# Altium footprint library 13-IC Packages-2smt2e.PcbLib: 86 footprints (part 3 of 6)
Each footprint in its own frame and in the unit in brackets; x right, y up, seen from the top. Pads: shape width x height; smd on the part's side, far side on the other; paste and mask are expansions set on the pad; w line width, h text height; cw(c..) or ccw(c..) is an arc to the next point about the centre after c.
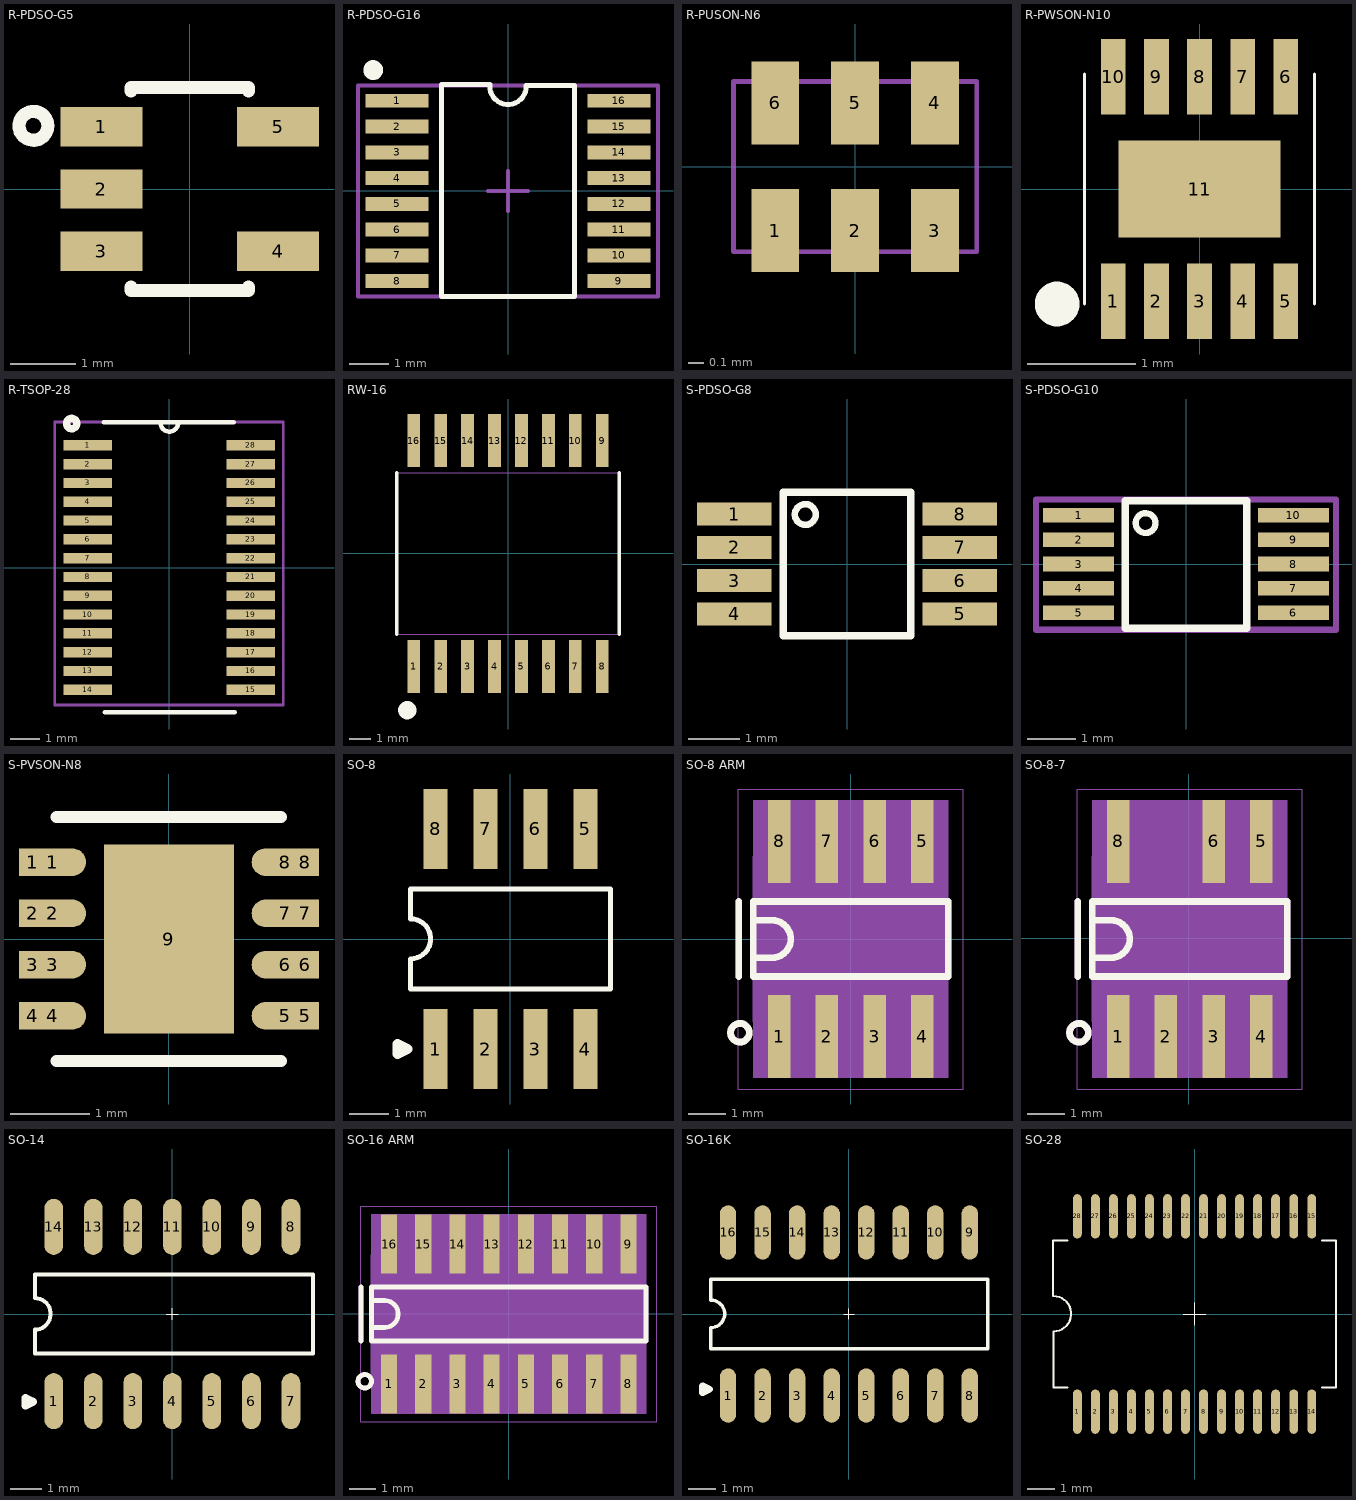
[diagram p2: the footprints below, top view; thin cyan lines are the x and y axes]

## R-PDSO-G5 [mm]
pads (5):
  rect 1.25x0.6 smd mask+0.07: 1(-1.35,0.95) 2(-1.35,0) 3(-1.35,-0.95) 4(1.35,-0.95) 5(1.35,0.95)
Top Overlay:
  circle w0.2: c-2.388,0.965 r0.22
  lines w0.2: -0.9,-1.5 -0.9,-1.55 0.9,-1.55 0.9,-1.5 ; -0.9,1.5 -0.9,1.55 0.9,1.55 0.9,1.5
3D body "tsot-23-5.stp": height 1, standoff 0.01, extent -1.475,-1.45 1.475,1.45

## R-PDSO-G16 [mm]
pads (16):
  rect 1.6x0.35 smd mask+0.07: 1(-2.8,2.275) 2(-2.8,1.625) 3(-2.8,0.975) 4(-2.8,0.325) 5(-2.8,-0.325) 6(-2.8,-0.975) 7(-2.8,-1.625) 8(-2.8,-2.275) 10(2.8,-1.625) 11(2.8,-0.975) 12(2.8,-0.325) 13(2.8,0.325) 14(2.8,0.975) 15(2.8,1.625) 16(2.8,2.275)
  rect 1.6x0.35 smd: 9(2.8,-2.275)
Top Overlay:
  circle w0.25: c-3.4,3.05 r0.125
  lines w0.127: -0.46,2.642 ccw(c0,2.642) 0.46,2.642 ; -0.457,2.692 -1.676,2.692 -1.676,-2.667 1.676,-2.667 1.676,2.667 0.457,2.667
Mechanical 15:
  lines w0.1: -0.5,0 0.5,0 ; 0,-0.5 0,0.5 ; -3.785,-2.667 -3.785,2.667 3.785,2.667 3.785,-2.667 -3.785,-2.667
3D body "r-pdso-g16.stp": height 1.2, standoff 0, extent -3.3,-2.55 3.3,2.55

## R-PUSON-N6 [mm]
pads (6):
  rect 0.3x0.52 smd mask+0.05: 1(-0.5,-0.4) 2(0,-0.4) 3(0.5,-0.4) 4(0.5,0.4) 5(0,0.4) 6(-0.5,0.4)
Top Solder:
  circle w0.1: c-0.889,-0.838 r0.102
  rectangle: 0.787,-0.508 0.889,0.508
  rectangle: -0.889,-0.508 -0.787,0.508
Mechanical 15:
  lines w0.03: -0.762,-0.533 0.762,-0.533 0.762,0.533 -0.762,0.533 -0.762,-0.533
3D body "tps62732.stp": height 0.61, standoff 0, extent -0.75,-0.525 0.75,0.525
3D body "0_254-0_508.stp": height 0.01, standoff 0, extent -0.127,-0.66 0.127,-0.152
3D body "0_254-0_508.stp": height 0.01, standoff 0, extent -0.635,-0.66 -0.381,-0.152
3D body "0_254-0_508.stp": height 0.01, standoff 0, extent 0.381,-0.66 0.635,-0.152
3D body "0_254-0_508.stp": height 0.01, standoff 0, extent 0.381,0.152 0.635,0.66
3D body "0_254-0_508.stp": height 0.01, standoff 0, extent -0.127,0.152 0.127,0.66
3D body "0_254-0_508.stp": height 0.01, standoff 0, extent -0.635,0.152 -0.381,0.66

## R-PWSON-N10 [mm]
pads (11):
  rect 0.23x0.7 smd mask+0.07: 1(-0.8,-1.041) 2(-0.4,-1.041) 3(0,-1.041) 4(0.4,-1.041) 5(0.8,-1.041) 6(0.8,1.041) 7(0.4,1.041) 8(0,1.041) 9(-0.4,1.041) 10(-0.8,1.041)
  rect 1.5x0.9 smd mask+0.051: 11(0,0)
Top Overlay:
  circle w0.254: c-1.321,-1.067 r0.08
  lines w0.025: -1.067,-1.067 -1.067,1.067 ; 1.067,-1.067 1.067,1.067
3D body "r-pwson-n10.stp": height 0.7, standoff 0, extent -1.05,-1.06 1.05,1.06

## R-TSOP-28 [mil]
pads (28):
  rect 66x14 smd: 1(-111,166.34) 2(-111,140.75) 3(-111,115.16) 4(-111,89.57) 5(-111,63.98) 6(-111,38.39) 7(-111,12.8) 8(-111,-12.8) 9(-111,-38.39) 10(-111,-63.98) 11(-111,-89.57) 12(-111,-115.16) 13(-111,-140.75) 14(-111,-166.34) 15(111,-166.34) 16(111,-140.75) 17(111,-115.16) 18(111,-89.57) 19(111,-63.98) 20(111,-38.39) 21(111,-12.8) 22(111,12.8) 23(111,38.39) 24(111,63.98) 25(111,89.57) 26(111,115.16) 27(111,140.75) 28(111,166.34)
Top Overlay:
  circle w10: c-133,196 r7
  lines w6: -89.5,198 87.5,198 ; -88,-197 89,-197 ; -12,197 ccw(c0,197) 12,197
Mechanical 15:
  lines w3.94: -156,-187 -156,198 155,198 155,-187 -156,-187
3D body "0_35-1_7.stp": height 0.39, standoff 0, extent 77.54,159.46 144.47,173.24
3D body "0_35-1_7.stp": height 0.39, standoff 0, extent 77.54,133.87 144.47,147.65
3D body "0_35-1_7.stp": height 0.39, standoff 0, extent 77.54,108.28 144.47,122.06
3D body "0_35-1_7.stp": height 0.39, standoff 0, extent 77.54,82.69 144.47,96.46
3D body "0_35-1_7.stp": height 0.39, standoff 0, extent 77.54,57.09 144.47,70.87
3D body "0_35-1_7.stp": height 0.39, standoff 0, extent 77.54,31.5 144.47,45.28
3D body "0_35-1_7.stp": height 0.39, standoff 0, extent 77.54,5.91 144.47,19.69
3D body "0_35-1_7.stp": height 0.39, standoff 0, extent 77.54,-19.68 144.47,-5.9
3D body "0_35-1_7.stp": height 0.39, standoff 0, extent 77.54,-45.27 144.47,-31.49
3D body "0_35-1_7.stp": height 0.39, standoff 0, extent 77.54,-70.86 144.47,-57.08
3D body "0_35-1_7.stp": height 0.39, standoff 0, extent 77.54,-96.45 144.47,-82.67
3D body "0_35-1_7.stp": height 0.39, standoff 0, extent 77.54,-122.04 144.47,-108.26
3D body "0_35-1_7.stp": height 0.39, standoff 0, extent 77.54,-147.63 144.47,-133.85
3D body "0_35-1_7.stp": height 0.39, standoff 0, extent 77.54,-173.22 144.47,-159.44
3D body "0_35-1_7.stp": height 0.39, standoff 0, extent -144.46,-173.22 -77.53,-159.44
3D body "0_35-1_7.stp": height 0.39, standoff 0, extent -144.46,-147.63 -77.53,-133.85
3D body "0_35-1_7.stp": height 0.39, standoff 0, extent -144.46,-122.04 -77.53,-108.26
3D body "0_35-1_7.stp": height 0.39, standoff 0, extent -144.46,-96.45 -77.53,-82.67
3D body "0_35-1_7.stp": height 0.39, standoff 0, extent -144.46,-70.86 -77.53,-57.08
3D body "0_35-1_7.stp": height 0.39, standoff 0, extent -144.46,-45.27 -77.53,-31.49
3D body "0_35-1_7.stp": height 0.39, standoff 0, extent -144.46,-19.68 -77.53,-5.9
3D body "0_35-1_7.stp": height 0.39, standoff 0, extent -144.46,5.91 -77.53,19.69
3D body "0_35-1_7.stp": height 0.39, standoff 0, extent -144.46,31.5 -77.53,45.28
3D body "0_35-1_7.stp": height 0.39, standoff 0, extent -144.46,57.09 -77.53,70.87
3D body "0_35-1_7.stp": height 0.39, standoff 0, extent -144.46,82.69 -77.53,96.46
3D body "0_35-1_7.stp": height 0.39, standoff 0, extent -144.46,108.28 -77.53,122.06
3D body "0_35-1_7.stp": height 0.39, standoff 0, extent -144.46,133.87 -77.53,147.65
3D body "0_35-1_7.stp": height 0.39, standoff 0, extent -144.46,159.46 -77.53,173.24
3D body "r-pdso-g28.stp": height 47.64, standoff 0, extent -128.78,-192.92 128.78,192.91

## RW-16 [mm]
pads (16):
  rect 0.6x2.5 smd: 1(-4.445,-5.325)
  rect 0.6x2.5 smd mask+0.07: 2(-3.175,-5.325) 3(-1.905,-5.325) 4(-0.635,-5.325) 5(0.635,-5.325) 6(1.905,-5.325) 7(3.175,-5.325) 8(4.445,-5.325) 9(4.445,5.325) 10(3.175,5.325) 11(1.905,5.325) 12(0.635,5.325) 13(-0.635,5.325) 14(-1.905,5.325) 15(-3.175,5.325) 16(-4.445,5.325)
Top Overlay:
  circle w0.5: c-4.75,-7.391 r0.178
  lines w0.178: -5.25,-3.8 -5.25,3.8 ; 5.25,-3.8 5.25,3.8
Mechanical 15:
  lines w0.03: -5.25,-3.8 5.25,-3.8 5.25,3.8 -5.25,3.8 -5.25,-3.8
3D body "0_55-2_5.stp": height 0.01, standoff 0, extent -4.695,-6.609 -4.145,-4.109
3D body "0_55-2_5.stp": height 0.01, standoff 0, extent -4.72,4.066 -4.17,6.566
3D body "0_55-2_5.stp": height 0.01, standoff 0, extent -3.45,4.066 -2.9,6.566
3D body "0_55-2_5.stp": height 0.01, standoff 0, extent -2.18,4.066 -1.63,6.566
3D body "0_55-2_5.stp": height 0.01, standoff 0, extent -0.91,4.066 -0.36,6.566
3D body "0_55-2_5.stp": height 0.01, standoff 0, extent 0.36,4.066 0.91,6.566
3D body "0_55-2_5.stp": height 0.01, standoff 0, extent 1.63,4.066 2.18,6.566
3D body "0_55-2_5.stp": height 0.01, standoff 0, extent 2.9,4.066 3.45,6.566
3D body "0_55-2_5.stp": height 0.01, standoff 0, extent 4.17,4.066 4.72,6.566
3D body "0_55-2_5.stp": height 0.01, standoff 0, extent 4.17,-6.584 4.72,-4.084
3D body "0_55-2_5.stp": height 0.01, standoff 0, extent 2.9,-6.584 3.45,-4.084
3D body "0_55-2_5.stp": height 0.01, standoff 0, extent 1.63,-6.584 2.18,-4.084
3D body "0_55-2_5.stp": height 0.01, standoff 0, extent 0.36,-6.584 0.91,-4.084
3D body "0_55-2_5.stp": height 0.01, standoff 0, extent -0.91,-6.584 -0.36,-4.084
3D body "0_55-2_5.stp": height 0.01, standoff 0, extent -2.18,-6.584 -1.63,-4.084
3D body "0_55-2_5.stp": height 0.01, standoff 0, extent -3.45,-6.584 -2.9,-4.084
3D body "0_55-2_5.stp": height 0.01, standoff 0, extent -4.745,-6.584 -4.195,-4.084
3D body "rw-16.stp": height 2.65, standoff 0.03, extent -5.25,-5.325 5.25,5.325

## S-PDSO-G8 [mm]
pads (8):
  rect 1.45x0.45 smd mask+0.05: 1(-2.2,0.975) 2(-2.2,0.325) 3(-2.2,-0.325) 4(-2.2,-0.975) 5(2.2,-0.975) 6(2.2,-0.325) 7(2.2,0.325) 8(2.2,0.975)
Top Overlay:
  circle w0.127: c-0.813,0.965 r0.203
  lines w0.152: -1.245,-1.4 1.245,-1.4 1.245,1.4 -1.245,1.4 -1.245,-1.4
3D body "ms0p-8l.stp": height 1.1, standoff 0.03, extent -2.45,-1.5 2.45,1.5

## S-PDSO-G10 [mm]
pads (10):
  rect 1.45x0.3 smd mask+0.05: 1(-2.2,1) 2(-2.2,0.5) 3(-2.2,0) 4(-2.2,-0.5) 5(-2.2,-1) 6(2.2,-1) 7(2.2,-0.5) 8(2.2,0) 9(2.2,0.5) 10(2.2,1)
Top Overlay:
  circle w0.127: c-0.828,0.838 r0.203
  lines w0.152: -1.245,-1.321 -1.245,1.295 1.245,1.295 1.245,-1.321 -1.245,-1.321
Mechanical 15:
  lines w0.127: -3.073,-1.346 -3.073,1.321 3.073,1.321 3.073,-1.346 -3.073,-1.346
3D body "s-pdso-g10.stp": height 1.1, standoff 0, extent -2.53,-1.55 2.53,1.55

## S-PVSON-N8 [mm]
pads (17):
  rect 0.35x0.35 smd mask+0.05: 1(-1.725,0.975) 2(-1.725,0.325) 3(-1.725,-0.325) 4(-1.725,-0.975) 5(1.729,-0.975) 6(1.729,-0.325) 7(1.729,0.325) 8(1.729,0.975)
  oval 0.85x0.35 smd mask+0.05: 1(-1.475,0.975) 2(-1.475,0.325) 3(-1.475,-0.325) 4(-1.475,-0.975) 5(1.475,-0.975) 6(1.475,-0.325) 7(1.475,0.325) 8(1.475,0.975)
  rect 1.65x2.4 smd mask+0.05: 9(0,0)
Top Overlay:
  lines w0.152: -1.422,-1.549 1.422,-1.549 ; -1.422,1.549 1.422,1.549
3D body "s-pvson-n8.stp": height 1, standoff 0, extent -1.505,-1.5 1.505,1.5

## SO-8 [mil]
pads (8):
  rect 24x80 smd mask+2.76: 1(-75,-110.24) 2(-25,-110.24) 3(25,-110.24) 4(75,-110.24) 5(75,110.24) 6(25,110.24) 7(-25,110.24)
  rect 24x80 smd: 8(-75,110.24)
Top Overlay:
  lines w5: -100,-50 100,-50 100,50 -100,50 -100,20.18 ; -99.97,-49.97 -99.97,-19.85 ccw(c-99.97,0.15) -99.97,20.15
  lines w10: -113,-115 -103,-110 -113,-105 -113,-115
3D body "sop-j8.stp": height 54.13, standoff -3.94, extent -96.45,-118.11 96.46,115.75
3D body "0_66-2_032.stp": height 0.79, standoff 0, extent -87.99,70 -62,150
3D body "0_66-2_032.stp": height 0.79, standoff 0, extent -37.99,70 -12,150
3D body "0_66-2_032.stp": height 0.79, standoff 0, extent 13.01,70 39,150
3D body "0_66-2_032.stp": height 0.79, standoff 0, extent 62.01,70 88,150
3D body "0_66-2_032.stp": height 0.79, standoff 0, extent -87.99,-150 -62,-70
3D body "0_66-2_032.stp": height 0.79, standoff 0, extent -37.99,-150 -12,-70
3D body "0_66-2_032.stp": height 0.79, standoff 0, extent 13.01,-150 39,-70
3D body "0_66-2_032.stp": height 0.79, standoff 0, extent 61.01,-150 87,-70

## SO-8 ARM [mm]
pads (8):
  rect 0.6x2.2 smd: 1(-1.905,-2.6) 2(-0.635,-2.6) 3(0.635,-2.6) 4(1.905,-2.6) 5(1.905,2.6) 6(0.635,2.6) 7(-0.635,2.6) 8(-1.905,2.6)
Top Overlay:
  circle w0.18: c-2.955,-2.5 r0.25
  lines w0.18: -2.99,-1 -2.99,1 ; -2.6,-0.5 -2.1,-0.5 ccw(c-2.1,0) -2.1,0.5 -2.6,0.5 ; -2.6,1 -2.6,-1 2.6,-1 2.6,1 -2.57,1
Mechanical 6:
  lines w0.18: -2.99,-1 -2.99,1 ; -2.6,-0.5 -2.1,-0.5 ccw(c-2.1,0) -2.1,0.5 -2.6,0.5 ; -2.6,1 -2.6,-1 2.6,-1 2.6,1 -2.57,1 ; -3.205,-2.5 cw(c-2.955,-2.5) -2.955,-2.25 cw(c-2.955,-2.5) -2.705,-2.5 cw(c-2.955,-2.5) -2.955,-2.75 cw(c-2.955,-2.5) -3.205,-2.5
Mechanical 16:
  circle w0.025: c-2.1,-1.1 r0.2
  region: -2.6,3.7 2.6,3.7 2.6,-3.7 -2.6,-3.7
  pour cut-out: -0.953,0.459 -1.128,0.424 -1.277,0.324 -1.376,0.176 -1.411,0 -1.376,-0.176 -1.277,-0.324 -1.128,-0.424 -0.953,-0.459 -0.777,-0.424 -0.628,-0.324 -0.529,-0.176 -0.494,0 -0.529,0.176 -0.628,0.324 -0.777,0.424
  pour cut-out: 0.953,0.459 0.777,0.424 0.628,0.324 0.529,0.176 0.494,0 0.529,-0.176 0.628,-0.324 0.777,-0.424 0.953,-0.459 1.128,-0.424 1.277,-0.324 1.376,-0.176 1.411,0 1.376,0.176 1.277,0.324 1.128,0.424
  lines w0.025: -2.6,-1.5 2.6,-1.5 ; -3,-4 -3,4 3,4 3,-4 -3,-4 ; -2.6,-2.2 -2.6,2.2 2.6,2.2 2.6,-2.2 -2.6,-2.2 ; -2.16,-3.1 -1.65,-3.1 -1.65,-2.2 -2.16,-2.2 -2.16,-3.1 ; -2.16,2.2 -2.16,3.1 -1.65,3.1 -1.65,2.2 -2.16,2.2 ; -0.89,-3.1 -0.38,-3.1 -0.38,-2.2 -0.89,-2.2 -0.89,-3.1 ; -0.89,2.2 -0.89,3.1 -0.38,3.1 -0.38,2.2 -0.89,2.2 ; 0.38,-3.1 0.89,-3.1 0.89,-2.2 0.38,-2.2 0.38,-3.1 ; 0.38,2.2 0.38,3.1 0.89,3.1 0.89,2.2 0.38,2.2 ; 1.65,-3.1 2.16,-3.1 2.16,-2.2 1.65,-2.2 1.65,-3.1 ; 1.65,2.2 1.65,3.1 2.16,3.1 2.16,2.2 1.65,2.2
Mechanical 18:
  text "8" at -1.905,2.4 h0.5
  text "2" at -0.635,-2.8 h0.5
  text "3" at 0.635,-2.8 h0.5
  text "4" at 1.905,-2.8 h0.5
  text "7" at -0.635,2.4 h0.5
  text "1" at -1.905,-2.8 h0.5
  text "5" at 1.905,2.4 h0.5
  text "6" at 0.635,2.4 h0.5
3D body "sop-j8.stp": height 1.38, standoff -0.1, extent -2.45,-3 2.45,2.94
3D body "so8-arm.stp": height 0, standoff 0, extent -2.205,1.5 -1.605,3.7
3D body "so8-arm.stp": height 0, standoff 0, extent -0.935,1.5 -0.335,3.7
3D body "so8-arm.stp": height 0, standoff 0, extent 0.335,1.5 0.935,3.7
3D body "so8-arm.stp": height 0, standoff 0, extent 1.605,1.5 2.205,3.7
3D body "so8-arm.stp": height 0, standoff 0, extent -2.205,-3.7 -1.605,-1.5
3D body "so8-arm.stp": height 0, standoff 0, extent -0.935,-3.7 -0.335,-1.5
3D body "so8-arm.stp": height 0, standoff 0, extent 0.335,-3.7 0.935,-1.5
3D body "so8-arm.stp": height 0, standoff 0, extent 1.605,-3.7 2.205,-1.5

## SO-8-7 [mm]
pads (7):
  rect 0.6x2.2 smd: 1(-1.88,-2.625) 2(-0.61,-2.625) 3(0.66,-2.625) 4(1.93,-2.625) 5(1.93,2.575) 6(0.66,2.575) 8(-1.88,2.575)
Top Overlay:
  circle w0.18: c-2.93,-2.525 r0.25
  lines w0.18: -2.965,-1.025 -2.965,0.975 ; -2.575,-0.525 -2.075,-0.525 ccw(c-2.075,-0.025) -2.075,0.475 -2.575,0.475 ; -2.575,0.975 -2.575,-1.025 2.625,-1.025 2.625,0.975 -2.545,0.975
Mechanical 6:
  lines w0.18: -2.965,-1.025 -2.965,0.975 ; -2.575,-0.525 -2.075,-0.525 ccw(c-2.075,-0.025) -2.075,0.475 -2.575,0.475 ; -2.575,0.975 -2.575,-1.025 2.625,-1.025 2.625,0.975 -2.545,0.975 ; -3.18,-2.525 ccw(c-2.93,-2.525) -2.93,-2.775 ccw(c-2.93,-2.525) -2.68,-2.525 ccw(c-2.93,-2.525) -2.93,-2.275 ccw(c-2.93,-2.525) -3.18,-2.525
Mechanical 16:
  circle w0.025: c-2.075,-1.125 r0.2
  pour cut-out: 0.978,0.433 0.802,0.398 0.653,0.299 0.554,0.15 0.519,-0.025 0.554,-0.201 0.653,-0.35 0.802,-0.449 0.978,-0.484 1.153,-0.449 1.302,-0.35 1.402,-0.201 1.437,-0.025 1.402,0.15 1.302,0.299 1.153,0.398
  pour cut-out: -0.927,0.433 -1.103,0.398 -1.252,0.299 -1.351,0.15 -1.386,-0.025 -1.351,-0.201 -1.252,-0.35 -1.103,-0.449 -0.927,-0.484 -0.752,-0.449 -0.603,-0.35 -0.503,-0.201 -0.468,-0.025 -0.503,0.15 -0.603,0.299 -0.752,0.398
  region: -2.575,3.675 2.625,3.675 2.625,-3.725 -2.575,-3.725
  lines w0.025: -2.575,-1.525 2.625,-1.525 ; -2.975,-4.025 3.025,-4.025 3.025,3.975 -2.975,3.975 -2.975,-4.025 ; -2.575,-2.225 2.625,-2.225 2.625,2.175 -2.575,2.175 -2.575,-2.225 ; -2.135,-3.125 -2.135,-2.225 -1.625,-2.225 -1.625,-3.125 -2.135,-3.125 ; -2.135,2.175 -1.625,2.175 -1.625,3.075 -2.135,3.075 -2.135,2.175 ; -0.865,-3.125 -0.865,-2.225 -0.355,-2.225 -0.355,-3.125 -0.865,-3.125 ; 0.405,-3.125 0.405,-2.225 0.915,-2.225 0.915,-3.125 0.405,-3.125 ; 0.405,2.175 0.915,2.175 0.915,3.075 0.405,3.075 0.405,2.175 ; 1.675,-3.125 1.675,-2.225 2.185,-2.225 2.185,-3.125 1.675,-3.125 ; 1.675,2.175 2.185,2.175 2.185,3.075 1.675,3.075 1.675,2.175
Mechanical 18:
  text "6" at 0.66,2.375 h0.5
  text "5" at 1.93,2.375 h0.5
  text "1" at -1.88,-2.825 h0.5
  text "7" at -0.61,2.375 h0.5
  text "4" at 1.93,-2.825 h0.5
  text "3" at 0.66,-2.825 h0.5
  text "2" at -0.61,-2.825 h0.5
  text "8" at -1.88,2.375 h0.5
3D body "so8-arm.stp": height 0, standoff 0, extent 1.63,-3.725 2.23,-1.525
3D body "so8-arm.stp": height 0, standoff 0, extent 0.36,-3.725 0.96,-1.525
3D body "so8-arm.stp": height 0, standoff 0, extent -0.91,-3.725 -0.31,-1.525
3D body "so8-arm.stp": height 0, standoff 0, extent -2.18,-3.725 -1.58,-1.525
3D body "so8-arm.stp": height 0, standoff 0, extent 1.63,1.475 2.23,3.675
3D body "so8-arm.stp": height 0, standoff 0, extent 0.36,1.475 0.96,3.675
3D body "so8-arm.stp": height 0, standoff 0, extent -2.18,1.475 -1.58,3.675
3D body "so-8-7.stp": height 1.7, standoff 0, extent -2.5,-3 2.5,3

## SO-14 [mm]
pads (14):
  oval 0.6x1.8 smd mask+0.07: 1(-3.81,-2.8) 2(-2.54,-2.8) 3(-1.27,-2.8) 5(1.27,-2.8) 6(2.54,-2.8) 7(3.81,-2.8) 8(3.81,2.8) 9(2.54,2.8) 10(1.27,2.8) 11(0,2.8) 12(-1.27,2.8) 13(-2.54,2.8) 14(-3.81,2.8)
  oval 0.6x1.8 smd mask+0.051: 4(0,-2.8)
Top Overlay:
  lines w0.01: -0.191,0 0.191,0 ; 0,-0.191 0,0.191
  lines w0.127: -4.42,-1.27 4.521,-1.27 4.521,1.27 -4.42,1.27 -4.42,0.513 ; -4.419,-1.269 -4.419,-0.504 ccw(c-4.419,0.004) -4.419,0.512
  lines w0.254: -4.724,-2.946 -4.724,-2.692 -4.47,-2.819 -4.724,-2.946
3D body "sop-14.stp": height 1.5, standoff -0.08, extent -4.315,-3.1 4.385,3.112
3D body "0_66-2_032.stp": height 0.02, standoff 0, extent 3.48,-3.716 4.14,-1.684
3D body "0_66-2_032.stp": height 0.02, standoff 0, extent 2.21,-3.716 2.87,-1.684
3D body "0_66-2_032.stp": height 0.02, standoff 0, extent 0.94,-3.716 1.6,-1.684
3D body "0_66-2_032.stp": height 0.02, standoff 0, extent -0.33,-3.716 0.33,-1.684
3D body "0_66-2_032.stp": height 0.02, standoff 0, extent -1.6,-3.716 -0.94,-1.684
3D body "0_66-2_032.stp": height 0.02, standoff 0, extent -2.87,-3.716 -2.21,-1.684
3D body "0_66-2_032.stp": height 0.02, standoff 0, extent -4.14,-3.716 -3.48,-1.684
3D body "0_66-2_032.stp": height 0.02, standoff 0, extent 3.48,1.684 4.14,3.716
3D body "0_66-2_032.stp": height 0.02, standoff 0, extent 2.21,1.684 2.87,3.716
3D body "0_66-2_032.stp": height 0.02, standoff 0, extent 0.94,1.684 1.6,3.716
3D body "0_66-2_032.stp": height 0.02, standoff 0, extent -0.33,1.684 0.33,3.716
3D body "0_66-2_032.stp": height 0.02, standoff 0, extent -1.6,1.684 -0.94,3.716
3D body "0_66-2_032.stp": height 0.02, standoff 0, extent -2.87,1.684 -2.21,3.716
3D body "0_66-2_032.stp": height 0.02, standoff 0, extent -4.14,1.684 -3.48,3.716

## SO-16 ARM [mm]
pads (16):
  rect 0.6x2.2 smd: 1(-4.445,-2.6) 2(-3.175,-2.6) 3(-1.905,-2.6) 4(-0.635,-2.6) 5(0.635,-2.6) 6(1.905,-2.6) 7(3.175,-2.6) 8(4.445,-2.6) 9(4.445,2.6) 10(3.175,2.6) 11(1.905,2.6) 12(0.635,2.6) 13(-0.635,2.6) 14(-1.905,2.6) 15(-3.175,2.6) 16(-4.445,2.6)
Top Overlay:
  circle w0.18: c-5.35,-2.5 r0.25
  lines w0.18: -5.49,-1 -5.49,1 ; -5.1,-0.5 -4.61,-0.5 ccw(c-4.61,0) -4.61,0.5 -5.1,0.5 ; -5.1,-1 -5.1,1 5.1,1 5.1,-1 -5.1,-1
Mechanical 6:
  lines w0.18: -5.49,-1 -5.49,1 ; -5.35,-2.75 cw(c-5.35,-2.5) -5.6,-2.5 cw(c-5.35,-2.5) -5.35,-2.25 cw(c-5.35,-2.5) -5.1,-2.5 ; -5.1,-0.5 -4.61,-0.5 ccw(c-4.61,0) -4.61,0.5 -5.1,0.5 ; -5.1,-1 -5.1,1 5.1,1 5.1,-1 -5.1,-1
Mechanical 16:
  circle w0.025: c-4.5,-1 r0.3
  region: -5.1,3.7 5.1,3.7 5.1,-3.7 -5.1,-3.7
  pour cut-out: 2.159,0 2.124,0.176 2.024,0.324 1.876,0.424 1.7,0.459 1.524,0.424 1.376,0.324 1.276,0.176 1.241,0 1.276,-0.176 1.376,-0.324 1.524,-0.424 1.7,-0.459 1.876,-0.424 2.024,-0.324 2.124,-0.176
  pour cut-out: -1.241,0 -1.276,0.176 -1.376,0.324 -1.524,0.424 -1.7,0.459 -1.876,0.424 -2.024,0.324 -2.124,0.176 -2.159,0 -2.124,-0.176 -2.024,-0.324 -1.876,-0.424 -1.7,-0.459 -1.524,-0.424 -1.376,-0.324 -1.276,-0.176
  lines w0.025: -5.1,-1.5 5.1,-1.5 ; -5.5,-4 -5.5,4 5.5,4 5.5,-4 -5.5,-4 ; -5.1,-2.2 -5.1,2.2 5.1,2.2 5.1,-2.2 -5.1,-2.2 ; -4.7,-3.1 -4.19,-3.1 -4.19,-2.2 -4.7,-2.2 -4.7,-3.1 ; -4.7,2.2 -4.7,3.1 -4.19,3.1 -4.19,2.2 -4.7,2.2 ; -3.43,-3.1 -2.92,-3.1 -2.92,-2.2 -3.43,-2.2 -3.43,-3.1 ; -3.43,2.2 -3.43,3.1 -2.92,3.1 -2.92,2.2 -3.43,2.2 ; -2.16,-3.1 -1.65,-3.1 -1.65,-2.2 -2.16,-2.2 -2.16,-3.1 ; -2.16,2.2 -2.16,3.1 -1.65,3.1 -1.65,2.2 -2.16,2.2 ; -0.89,-3.1 -0.38,-3.1 -0.38,-2.2 -0.89,-2.2 -0.89,-3.1 ; -0.89,2.2 -0.89,3.1 -0.38,3.1 -0.38,2.2 -0.89,2.2 ; 0.38,-3.1 0.89,-3.1 0.89,-2.2 0.38,-2.2 0.38,-3.1 ; 0.38,2.2 0.38,3.1 0.89,3.1 0.89,2.2 0.38,2.2 ; 1.65,-3.1 2.16,-3.1 2.16,-2.2 1.65,-2.2 1.65,-3.1 ; 1.65,2.2 1.65,3.1 2.16,3.1 2.16,2.2 1.65,2.2 ; 2.92,-3.1 3.43,-3.1 3.43,-2.2 2.92,-2.2 2.92,-3.1 ; 2.92,2.2 2.92,3.1 3.43,3.1 3.43,2.2 2.92,2.2 ; 4.19,-3.1 4.7,-3.1 4.7,-2.2 4.19,-2.2 4.19,-3.1 ; 4.19,2.2 4.19,3.1 4.7,3.1 4.7,2.2 4.19,2.2
Mechanical 18:
  text "14" at -2.305,2.6 h0.5
  text "13" at -1.035,2.6 h0.5
  text "8" at 4.245,-2.6 h0.5
  text "10" at 2.775,2.6 h0.5
  text "7" at 2.975,-2.6 h0.5
  text "9" at 4.245,2.6 h0.5
  text "16" at -4.845,2.6 h0.5
  text "15" at -3.575,2.6 h0.5
  text "1" at -4.645,-2.6 h0.5
  text "4" at -0.835,-2.6 h0.5
  text "6" at 1.705,-2.6 h0.5
  text "2" at -3.375,-2.6 h0.5
  text "5" at 0.435,-2.6 h0.5
  text "3" at -2.105,-2.6 h0.5
  text "11" at 1.505,2.6 h0.5
  text "12" at 0.235,2.6 h0.5
3D body "so8-arm.stp": height 0, standoff 0, extent -4.745,-3.7 -4.145,-1.5
3D body "so8-arm.stp": height 0, standoff 0, extent -3.475,-3.7 -2.875,-1.5
3D body "so8-arm.stp": height 0, standoff 0, extent -2.205,-3.7 -1.605,-1.5
3D body "so8-arm.stp": height 0, standoff 0, extent -0.935,-3.7 -0.335,-1.5
3D body "so8-arm.stp": height 0, standoff 0, extent 0.335,-3.7 0.935,-1.5
3D body "so8-arm.stp": height 0, standoff 0, extent 1.605,-3.7 2.205,-1.5
3D body "so8-arm.stp": height 0, standoff 0, extent 2.875,-3.7 3.475,-1.5
3D body "so8-arm.stp": height 0, standoff 0, extent 4.145,-3.7 4.745,-1.5
3D body "so8-arm.stp": height 0, standoff 0, extent 4.145,1.5 4.745,3.7
3D body "so8-arm.stp": height 0, standoff 0, extent 2.875,1.5 3.475,3.7
3D body "so8-arm.stp": height 0, standoff 0, extent 1.605,1.5 2.205,3.7
3D body "so8-arm.stp": height 0, standoff 0, extent 0.335,1.5 0.935,3.7
3D body "so8-arm.stp": height 0, standoff 0, extent -0.935,1.5 -0.335,3.7
3D body "so8-arm.stp": height 0, standoff 0, extent -2.205,1.5 -1.605,3.7
3D body "so8-arm.stp": height 0, standoff 0, extent -3.475,1.5 -2.875,3.7
3D body "so8-arm.stp": height 0, standoff 0, extent -4.745,1.5 -4.145,3.7
3D body "so-16.stp": height 1.75, standoff 0.02, extent -5,-3.1 5,3.1

## SO-16K [mm]
pads (16):
  oval 0.6x2 smd mask+0.07: 1(-4.445,-3) 2(-3.175,-3) 3(-1.905,-3) 5(0.635,-3) 6(1.905,-3) 7(3.175,-3) 8(4.445,-3) 9(4.445,3) 10(3.175,3) 11(1.905,3) 12(0.635,3) 13(-0.635,3) 14(-1.905,3) 15(-3.175,3) 16(-4.445,3)
  oval 0.6x2 smd mask+0.051: 4(-0.635,-3)
Top Overlay:
  lines w0.01: -0.191,0 0.191,0 ; 0,-0.191 0,0.191
  lines w0.127: -5.08,-1.27 5.105,-1.27 5.105,1.27 -5.08,1.27 -5.08,0.513 ; -5.079,-1.269 -5.079,-0.504 ccw(c-5.079,0.004) -5.079,0.512
  lines w0.254: -5.385,-2.896 -5.131,-2.769 -5.385,-2.642 -5.385,-2.896
3D body "0_66-2_032.stp": height 0.02, standoff 0, extent 4.115,-4.016 4.775,-1.984
3D body "0_66-2_032.stp": height 0.02, standoff 0, extent 2.845,-4.016 3.505,-1.984
3D body "0_66-2_032.stp": height 0.02, standoff 0, extent 1.575,-4.013 2.235,-1.981
3D body "0_66-2_032.stp": height 0.02, standoff 0, extent 0.305,-4.016 0.965,-1.984
3D body "0_66-2_032.stp": height 0.02, standoff 0, extent -0.965,-4.016 -0.305,-1.984
3D body "0_66-2_032.stp": height 0.02, standoff 0, extent -2.235,-4.016 -1.575,-1.984
3D body "0_66-2_032.stp": height 0.02, standoff 0, extent -3.505,-4.016 -2.845,-1.984
3D body "0_66-2_032.stp": height 0.02, standoff 0, extent -4.775,-4.016 -4.115,-1.984
3D body "0_66-2_032.stp": height 0.02, standoff 0, extent 4.115,1.981 4.775,4.013
3D body "0_66-2_032.stp": height 0.02, standoff 0, extent 2.845,1.984 3.505,4.016
3D body "0_66-2_032.stp": height 0.02, standoff 0, extent 1.575,1.984 2.235,4.016
3D body "0_66-2_032.stp": height 0.02, standoff 0, extent 0.305,1.984 0.965,4.016
3D body "0_66-2_032.stp": height 0.02, standoff 0, extent -0.965,1.984 -0.305,4.016
3D body "0_66-2_032.stp": height 0.02, standoff 0, extent -2.235,1.981 -1.575,4.013
3D body "0_66-2_032.stp": height 0.02, standoff 0, extent -3.505,1.984 -2.845,4.016
3D body "0_66-2_032.stp": height 0.02, standoff 0, extent -4.775,1.984 -4.115,4.016
3D body "so-16.stp": height 1.75, standoff 0.02, extent -5,-3.1 5,3.1

## SO-28 [mm]
pads (28):
  oval 0.32x1.6 smd mask+0.051: 1(-4.225,-3.52) 2(-3.575,-3.52) 3(-2.925,-3.52) 4(-2.275,-3.52) 5(-1.625,-3.52) 6(-0.975,-3.52) 7(-0.325,-3.52) 8(0.325,-3.52) 9(0.975,-3.52) 10(1.625,-3.52) 11(2.275,-3.52) 12(2.925,-3.52) 13(3.575,-3.52) 14(4.225,-3.52) 15(4.225,3.52) 16(3.575,3.52) 17(2.925,3.52) 18(2.275,3.52) 19(1.625,3.52) 20(0.975,3.52) 21(0.325,3.52) 22(-0.325,3.52) 23(-0.975,3.52) 24(-1.625,3.52) 25(-2.275,3.52) 26(-2.925,3.52) 27(-3.575,3.52) 28(-4.225,3.52)
Top Overlay:
  lines w0.025: -0.4,0 0.4,0 ; 0,-0.4 0,0.4
  lines w0.076: -5.1,0.644 -5.1,2.655 -4.59,2.655 ; -5.08,-0.63 -5.08,-2.645 -4.59,-2.645 ; -5.08,-0.626 ccw(c-5.08,0.009) -5.08,0.644 ; 4.59,-2.645 5.08,-2.645 ; 4.59,2.655 5.1,2.655 5.1,-2.645
3D body "ssop28.stp": height 1.65, standoff 0, extent -4.95,-3.7 4.95,3.7